# Altium footprint library Lib_001.PcbLib: 429 footprints (part 26 of 28)
Each footprint in its own frame and in the unit in brackets; x right, y up, seen from the top. Pads: shape width x height; smd on the part's side, far side on the other; paste and mask are expansions set on the pad; w line width, h text height; cw(c..) or ccw(c..) is an arc to the next point about the centre after c.
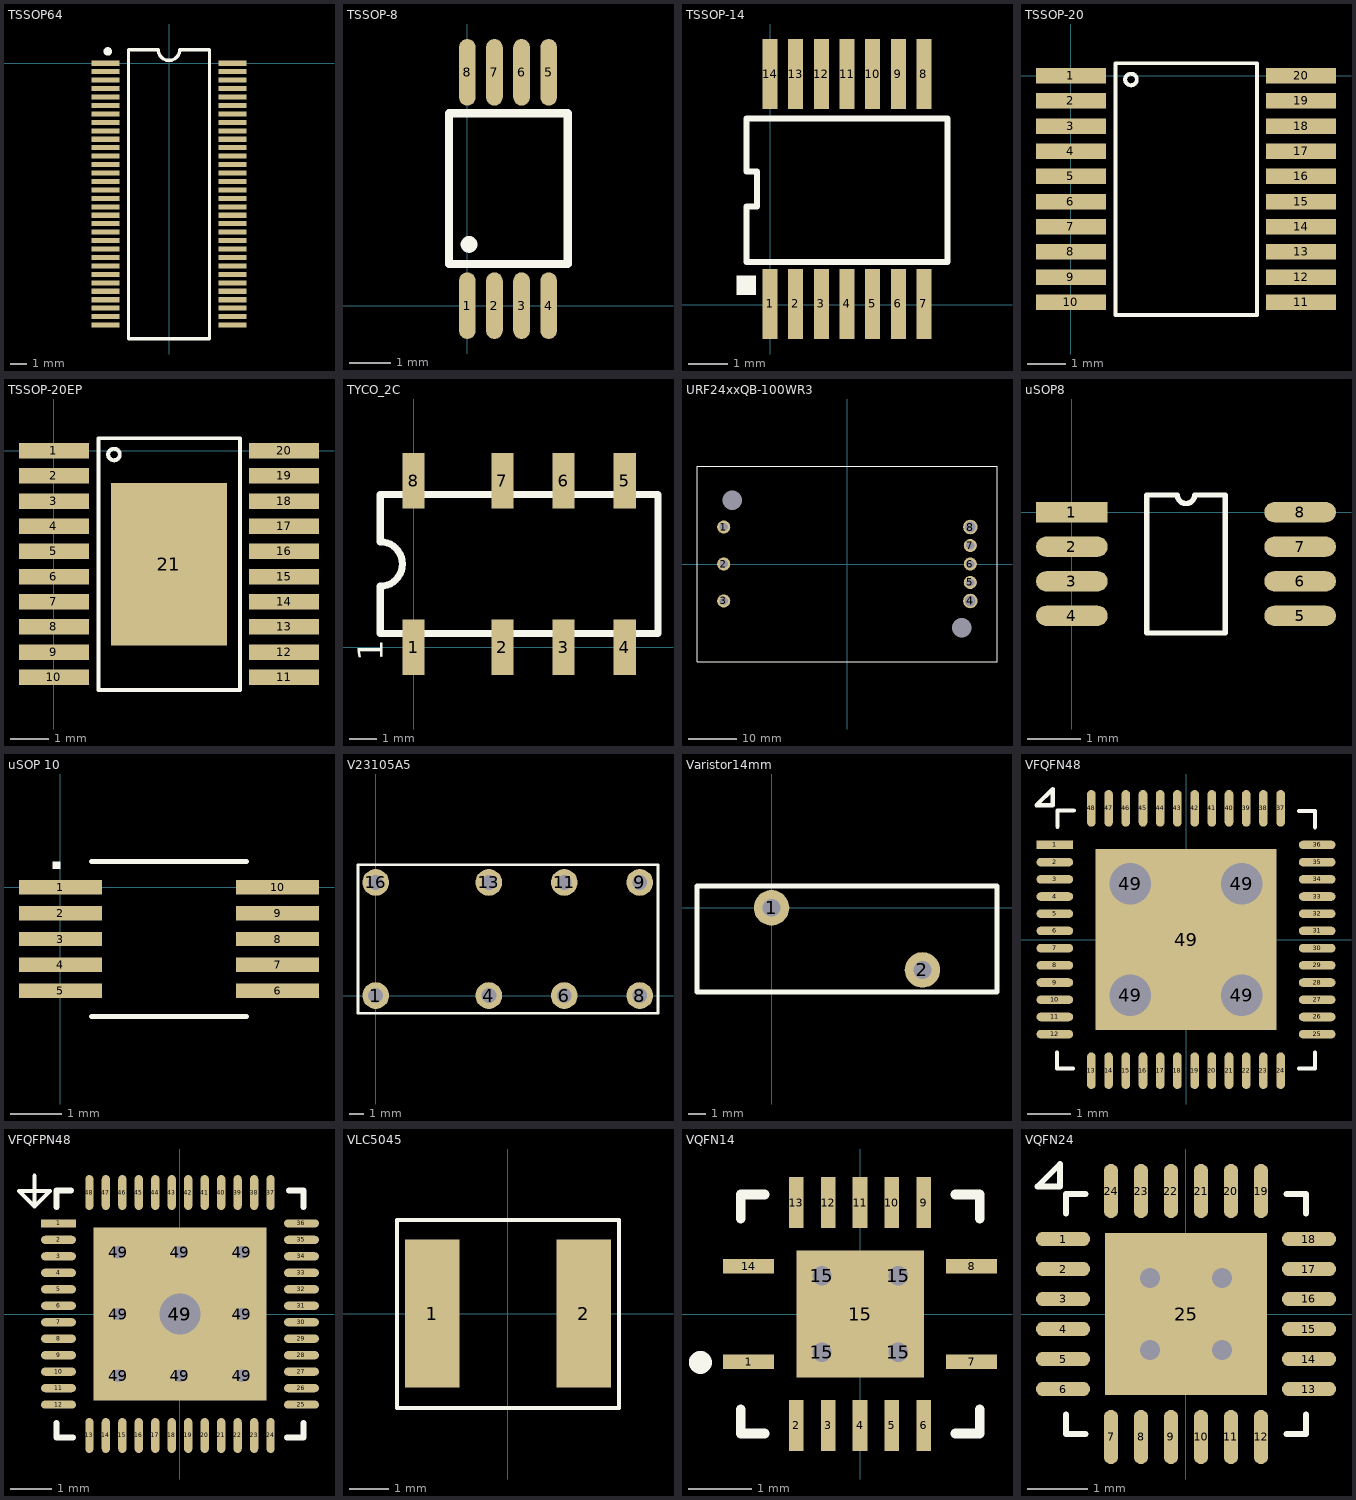
[diagram p25: the footprints below, top view; thin cyan lines are the x and y axes]

## TSSOP64 [mm]
pads (64):
  rect 1.65x0.3 smd: 1(-3.75,0) 2(-3.75,-0.5) 3(-3.75,-1) 4(-3.75,-1.5) 5(-3.75,-2) 6(-3.75,-2.5) 7(-3.75,-3) 8(-3.75,-3.5) 9(-3.75,-4) 10(-3.75,-4.5) 11(-3.75,-5) 12(-3.75,-5.5) 13(-3.75,-6) 14(-3.75,-6.5) 15(-3.75,-7) 16(-3.75,-7.5) 17(-3.75,-8) 18(-3.75,-8.5) 19(-3.75,-9) 20(-3.75,-9.5) 21(-3.75,-10) 22(-3.75,-10.5) 23(-3.75,-11) 24(-3.75,-11.5) 25(-3.75,-12) 26(-3.75,-12.5) 27(-3.75,-13) 28(-3.75,-13.5) 29(-3.75,-14) 30(-3.75,-14.5) 31(-3.75,-15) 32(-3.75,-15.5) 33(3.75,-15.5) 34(3.75,-15) 35(3.75,-14.5) 36(3.75,-14) 37(3.75,-13.5) 38(3.75,-13) 39(3.75,-12.5) 40(3.75,-12) 41(3.75,-11.5) 42(3.75,-11) 43(3.75,-10.5) 44(3.75,-10) 45(3.75,-9.5) 46(3.75,-9) 47(3.75,-8.5) 48(3.75,-8) 49(3.75,-7.5) 50(3.75,-7) 51(3.75,-6.5) 52(3.75,-6) 53(3.75,-5.5) 54(3.75,-5) 55(3.75,-4.5) 56(3.75,-4) 57(3.75,-3.5) 58(3.75,-3) 59(3.75,-2.5) 60(3.75,-2) 61(3.75,-1.5) 62(3.75,-1) 63(3.75,-0.5) 64(3.75,0)
Top Overlay:
  circle w0.25: c-3.625,0.7 r0.125
  lines w0.2: -2.4,-16.3 2.4,-16.3 2.4,0.8 0.635,0.8 cw(c0,0.8) -0.635,0.8 -2.4,0.8 -2.4,-16.3
3D body "DGG64.step": height 1.2, standoff 0, extent -4.149,-16.3 4.157,0.794

## TSSOP-8 [mm]
pads (8):
  oval 0.4x1.6 smd: 1(0,0) 2(0.65,0) 3(1.3,0) 4(1.95,0) 5(1.95,5.6) 6(1.3,5.6) 7(0.65,5.6) 8(0,5.6)
Top Overlay:
  circle w0.2: c0.04,1.47 r0.1
  lines w0.2: -0.44,1 -0.44,4.62 2.41,4.62 2.41,1 -0.44,1
3D body "User Library-TSSOP8.step": height 1.15, standoff -0.05, extent -0.56,-0.35 2.54,6.05

## TSSOP-14 [mil]
pads (14):
  rect 15x70 smd: 1(0,1) 2(25.59,1) 3(51.18,1) 4(76.77,1) 5(102.36,1) 6(127.95,1) 7(153.54,1) 8(153.54,230.31) 9(127.95,230.31) 10(102.36,230.31) 11(76.77,230.31) 12(51.18,230.31) 13(25.59,230.31) 14(0,230.31)
Top Overlay:
  rectangle: -33.46,9.84 -13.78,29.53
  lines w6: -23.62,43 177.16,43 177.16,185.94 -23.62,185.94 -23.62,133 -12.8,133 -12.8,98 -23.62,98 -23.62,43
3D body "User Library-TSSOP.step": height 47.24, standoff 0, extent -23.62,-13.48 177.16,242.43

## TSSOP-20 [mm]
pads (20):
  rect 1.8x0.4 smd: 1(0,0) 2(0,-0.65) 3(0,-1.3) 4(0,-1.95) 5(0,-2.6) 6(0,-3.25) 7(0,-3.9) 8(0,-4.55) 9(0,-5.2) 10(0,-5.85) 11(5.94,-5.85) 12(5.94,-5.2) 13(5.94,-4.55) 14(5.94,-3.9) 15(5.94,-3.25) 16(5.94,-2.6) 17(5.94,-1.95) 18(5.94,-1.3) 19(5.94,-0.65) 20(5.94,0)
Top Overlay:
  circle w0.1: c1.55,-0.1 r0.15
  lines w0.1: 1.15,-6.18 4.8,-6.18 4.8,0.32 1.15,0.32 1.15,-6.18
3D body "User Library-TSSOP-20.step": height 1.2, standoff 0, extent -0.305,-6.23 6.245,0.37

## TSSOP-20EP [mm] "TSSOP-20 with Exposed Pad"
pads (21):
  rect 1.8x0.4 smd: 1(0,0) 2(0,-0.65) 3(0,-1.3) 4(0,-1.95) 5(0,-2.6) 6(0,-3.25) 7(0,-3.9) 8(0,-4.55) 9(0,-5.2) 10(0,-5.85) 11(5.94,-5.85) 12(5.94,-5.2) 13(5.94,-4.55) 14(5.94,-3.9) 15(5.94,-3.25) 16(5.94,-2.6) 17(5.94,-1.95) 18(5.94,-1.3) 19(5.94,-0.65) 20(5.94,0)
  rect 3x4.2 smd: 21(2.97,-2.93)
Top Overlay:
  circle w0.1: c1.55,-0.1 r0.15
  lines w0.1: 1.15,-6.18 1.15,0.32 4.8,0.32 4.8,-6.18 1.15,-6.18
3D body "User Library-TSSOP-20.step": height 1.2, standoff 0, extent -0.305,-6.23 6.245,0.37

## TYCO_2C [mm]
height 5.65
pads (8):
  rect 0.8x2 smd: 1(0,0) 2(3.2,0) 3(5.4,0) 4(7.6,0) 5(7.6,6) 6(5.4,6) 7(3.2,6) 8(0,6)
Top Overlay:
  lines w0.254: -1.2,0.5 8.8,0.5 8.8,5.5 -1.2,5.5 -1.2,3.8 cw(c-1.2,3) -0.4,3 cw(c-1.2,3) -1.2,2.2 -1.2,0.5
  text "1" at -0.8,-0.5 h1.52
3D body: height 5.65, standoff 0, extent -1.2,0.5 8.8,5.5

## URF24xxQB-100WR3 [mm]
pads (10):
  round 2.7 hole 1.7: 1(-25.4,7.62) 2(-25.4,0) 3(-25.4,-7.62) 5(25.4,-3.81) 6(25.4,0) 7(25.4,3.81)
  round 3 hole 2.2: 4(25.4,-7.62) 8(25.4,7.62)
  round 0.6 hole 4 unplated: ""(-23.6,13.1) ""(23.6,-13.1)
Top Overlay:
  lines w0.2: -30.9,-20.1 30.9,-20.1 30.9,20.1 -30.9,20.1 -30.9,-20.1
3D body "URF_QB-100WR3-Mod.stp": height 12.8, standoff -6, extent -30.9,-20.1 30.9,20.1

## uSOP8 [mm]
pads (8):
  rect 1.35x0.38 smd: 1(0,0)
  oval 1.35x0.38 smd: 2(0,-0.65) 3(0,-1.3) 4(0,-1.95) 5(4.3,-1.95) 6(4.3,-1.3) 7(4.3,-0.65) 8(4.3,0)
Top Overlay:
  lines w0.1: 1.41,-2.275 2.89,-2.275 2.89,0.325 2.312,0.325 cw(c2.15,0.325) 1.987,0.325 1.41,0.325 1.41,-2.275
3D body "User Library-usop-8.step": height 1.1, standoff 0, extent -0.415,-2.525 4.615,0.575

## uSOP 10 [mm] "uSOP 10"
pads (10):
  rect 1.6x0.28 smd: 1(0,0) 2(0,-0.5) 3(0,-1) 4(0,-1.5) 5(0,-2) 6(4.2,-2) 7(4.2,-1.5) 8(4.2,-1) 9(4.2,-0.5) 10(4.2,0)
Top Overlay:
  rectangle: -0.15,0.35 0,0.5
  lines w0.1: 0.6,-2.5 3.6,-2.5 ; 0.6,0.5 3.6,0.5
Top Solder:
  rectangle: 1.22,-2.1 2.98,0.1
3D body: height 1.1, standoff 0, extent 0.6,-2.5 3.6,0.5

## V23105A5 [mm]
pads (8):
  round 1.8 hole 1: 1(0,0) 4(7.62,0) 6(12.7,0) 8(17.78,0) 9(17.78,7.62) 11(12.7,7.62) 13(7.62,7.62) 16(0,7.62)
Top Overlay:
  lines w0.2: -1.19,-1.19 -1.19,8.81 19.01,8.81 19.01,-1.19 -1.19,-1.19
3D body "User Library-V23105A5301A201.step": height 11.41, standoff -2.3, extent -1.26,-1.19 18.94,8.81

## Varistor14mm [mm]
pads (2):
  round 2 hole 1: 1(0,0) 2(8.5,-3.5)
Top Overlay:
  lines w0.3: -4.2,-4.75 -4.2,0 -4.2,1.23 12.7,1.23 12.7,0 12.7,-4.75 1.95,-4.75 -4.2,-4.75
3D body "User Library-Varistor 14mm.step": height 20.5, standoff -2.5, extent -4.319,-4.58 12.674,1.02

## VFQFN48 [mm]
pads (53):
  rect 0.85x0.2 smd: 1(-3.05,2.2)
  oval 0.85x0.2 smd: 2(-3.05,1.8) 3(-3.05,1.4) 4(-3.05,1) 5(-3.05,0.6) 6(-3.05,0.2) 7(-3.05,-0.2) 8(-3.05,-0.6) 9(-3.05,-1) 10(-3.05,-1.4) 11(-3.05,-1.8) 12(-3.05,-2.2) 25(3.05,-2.2) 26(3.05,-1.8) 27(3.05,-1.4) 28(3.05,-1) 29(3.05,-0.6) 30(3.05,-0.2) 31(3.05,0.2) 32(3.05,0.6) 33(3.05,1) 34(3.05,1.4) 35(3.05,1.8) 36(3.05,2.2)
  oval 0.2x0.85 smd: 13(-2.2,-3.05) 14(-1.8,-3.05) 15(-1.4,-3.05) 16(-1,-3.05) 17(-0.6,-3.05) 18(-0.2,-3.05) 19(0.2,-3.05) 20(0.6,-3.05) 21(1,-3.05) 22(1.4,-3.05) 23(1.8,-3.05) 24(2.2,-3.05) 37(2.2,3.05) 38(1.8,3.05) 39(1.4,3.05) 40(1,3.05) 41(0.6,3.05) 42(0.2,3.05) 43(-0.2,3.05) 44(-0.6,3.05) 45(-1,3.05) 46(-1.4,3.05) 47(-1.8,3.05) 48(-2.2,3.05)
  rect 1.575x1.575 hole 0.965: 49(-1.3,-1.3) 49(-1.3,1.3) 49(1.3,-1.3) 49(1.3,1.3)
  rect 4.2x4.2 smd: 49(0,0)
Top Overlay:
  lines w0.1: -3,-2.625 -3,-3 -2.625,-3 ; -2.988,2.625 -2.988,3 -2.613,3 ; 2.625,-3 3,-3 3,-2.625 ; 2.625,2.987 3,2.987 3,2.612 ; -3.475,3.125 -3.1,3.125 -3.1,3.5 -3.475,3.125
3D body: height 0.9, standoff 0, extent -3,-3 3,3

## VFQFPN48 [mm]
pads (58):
  rect 0.85x0.2 smd: 1(-2.95,2.2)
  oval 0.85x0.2 smd: 2(-2.95,1.8) 3(-2.95,1.4) 4(-2.95,1) 5(-2.95,0.6) 6(-2.95,0.2) 7(-2.95,-0.2) 8(-2.95,-0.6) 9(-2.95,-1) 10(-2.95,-1.4) 11(-2.95,-1.8) 12(-2.95,-2.2) 25(2.95,-2.2) 26(2.95,-1.8) 27(2.95,-1.4) 28(2.95,-1) 29(2.95,-0.6) 30(2.95,-0.2) 31(2.95,0.2) 32(2.95,0.6) 33(2.95,1) 34(2.95,1.4) 35(2.95,1.8) 36(2.95,2.2)
  oval 0.2x0.85 smd: 13(-2.2,-2.95) 14(-1.8,-2.95) 15(-1.4,-2.95) 16(-1,-2.95) 17(-0.6,-2.95) 18(-0.2,-2.95) 19(0.2,-2.95) 20(0.6,-2.95) 21(1,-2.95) 22(1.4,-2.95) 23(1.8,-2.95) 24(2.2,-2.95) 37(2.2,2.95) 38(1.8,2.95) 39(1.4,2.95) 40(1,2.95) 41(0.6,2.95) 42(0.2,2.95) 43(-0.2,2.95) 44(-0.6,2.95) 45(-1,2.95) 46(-1.4,2.95) 47(-1.8,2.95) 48(-2.2,2.95)
  round 0.6 hole 0.3: 49(-1.5,-1.5) 49(-1.5,0) 49(-1.5,1.5) 49(0,-1.5) 49(0,1.5) 49(1.5,-1.5) 49(1.5,0) 49(1.5,1.5)
  rect 4.2x4.2 smd: 49(0,0)
  round 1.6 hole 1: 49(0,0)
Top Overlay:
  lines w0.1: -3.534,3.358 -3.534,2.983 ; -3.534,2.608 -3.159,2.983 -3.534,2.983 ; -3.534,2.608 -3.909,2.983 -3.534,2.983 ; -3.534,2.608 -3.534,2.983
  lines w0.15: -3,-2.644 -3,-3 -2.604,-3 ; -3,2.604 -3,3 -2.644,3 ; 2.604,-3 3,-3 3,-2.644 ; 2.644,3 3,3 3,2.604
3D body "9DBL0951BKILF.stp": height 1, standoff 0, extent -3.05,-3.05 3.05,3.05

## VLC5045 [mm]
pads (2):
  rect 1.4x3.8 smd: 1(-1.95,0) 2(1.95,0)
Top Overlay:
  lines w0.1: -2.85,-2.425 -2.85,2.4 2.85,2.4 2.85,-2.425 -2.85,-2.425
3D body "User Library-Inductor VLC5045 Series.step": height 4.5, standoff 0, extent -2.497,-2.488 2.503,2.512

## VQFN14 [mm]
pads (19):
  rect 0.8x0.23 smd: 1(-1.75,-0.75) 7(1.75,-0.75) 8(1.75,0.75) 14(-1.75,0.75)
  rect 0.23x0.8 smd: 2(-1,-1.75) 3(-0.5,-1.75) 4(0,-1.75) 5(0.5,-1.75) 6(1,-1.75) 9(1,1.75) 10(0.5,1.75) 11(0,1.75) 12(-0.5,1.75) 13(-1,1.75)
  round 0.6 hole 0.3: 15(-0.6,-0.6) 15(-0.6,0.6) 15(0.6,-0.6) 15(0.6,0.6)
  rect 2x2 smd: 15(0,0)
Top Overlay:
  circle w0.254: c-2.507,-0.76 r0.053
  lines w0.15: -1.876,-1.495 -1.876,-1.876 -1.495,-1.876 ; -1.876,1.495 -1.876,1.876 -1.495,1.876 ; 1.495,-1.876 1.876,-1.876 1.876,-1.495 ; 1.495,1.876 1.876,1.876 1.876,1.495
3D body "RHL14_2P05X2P05_TEX.step": height 0.74, standoff 0, extent -1.876,-1.876 1.876,1.876

## VQFN24 [mm] "24-Pin Quad Flat No-Lead 0.5 mm Pitch, IPC Low Density"
height 1
pads (25):
  oval 0.9x0.24 smd: 1(-2.05,1.25) 2(-2.05,0.75) 3(-2.05,0.25) 4(-2.05,-0.25) 5(-2.05,-0.75) 6(-2.05,-1.25) 13(2.05,-1.25) 14(2.05,-0.75) 15(2.05,-0.25) 16(2.05,0.25) 17(2.05,0.75) 18(2.05,1.25)
  oval 0.24x0.9 smd: 7(-1.25,-2.05) 8(-0.75,-2.05) 9(-0.25,-2.05) 10(0.25,-2.05) 11(0.75,-2.05) 12(1.25,-2.05) 19(1.25,2.05) 20(0.75,2.05) 21(0.25,2.05) 22(-0.25,2.05) 23(-0.75,2.05) 24(-1.25,2.05)
  rect 2.7x2.7 smd: 25(0,0)
via -0.6,0.6 diameter 0.66 hole 0.33
via 0.6,0.6 diameter 0.66 hole 0.33
via -0.6,-0.6 diameter 0.66 hole 0.33
via 0.6,-0.6 diameter 0.66 hole 0.33
Top Overlay:
  lines w0.1: -2,-1.675 -2,-2 -1.675,-2 ; -2,1.675 -2,2 -1.675,2 ; 1.675,-2 2,-2 2,-1.675 ; 1.675,2 2,2 2,1.675 ; -2.475,2.125 -2.1,2.5 -2.1,2.125 -2.475,2.125
Mechanical 15:
  lines w0.1: -0.5,0 0.5,0 ; 0,-0.5 0,0.5
3D body: height 0.9, standoff 0, extent -2,-2 2,2